# Altium footprint library SMotlaq-PCB_lib.PcbLib: 186 footprints (part 12 of 12)
Each footprint in its own frame and in the unit in brackets; x right, y up, seen from the top. Pads: shape width x height; smd on the part's side, far side on the other; paste and mask are expansions set on the pad; w line width, h text height; cw(c..) or ccw(c..) is an arc to the next point about the centre after c.
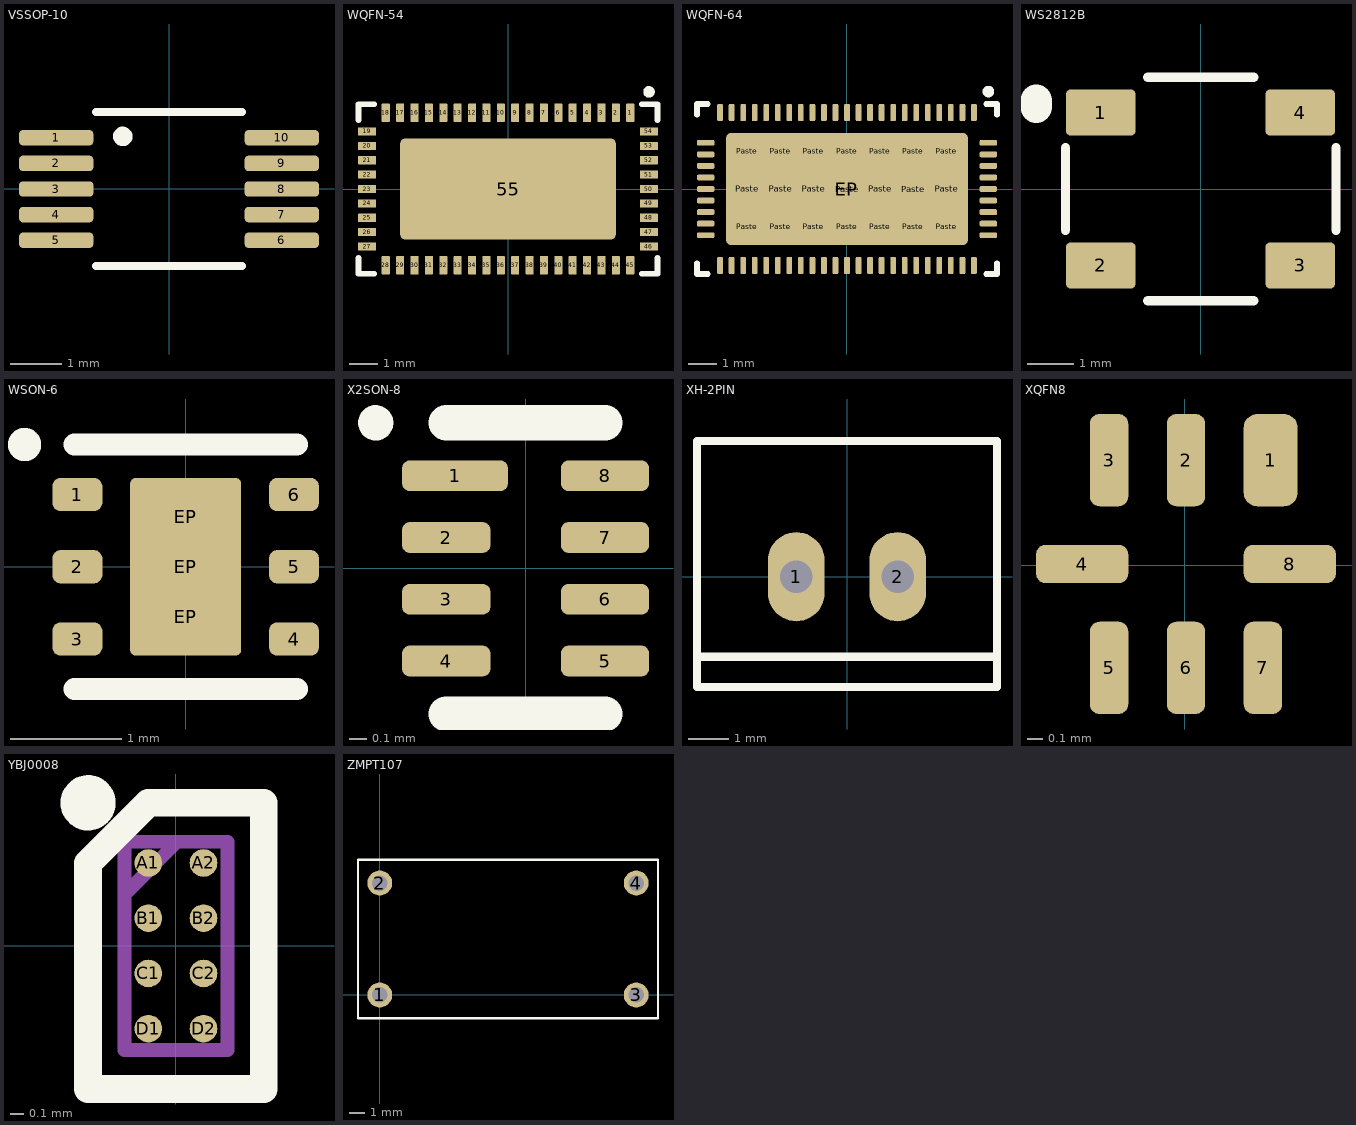
[diagram p11: the footprints below, top view; thin cyan lines are the x and y axes]

## VSSOP-10 [mm]
pads (10):
  rrect50% 1.45x0.3 smd: 1(-2.2,1) 2(-2.2,0.5) 3(-2.2,0) 4(-2.2,-0.5) 5(-2.2,-1) 6(2.2,-1) 7(2.2,-0.5) 8(2.2,0) 9(2.2,0.5) 10(2.2,1)
Top Overlay:
  circle w0.2: c-0.9,1.025 r0.09
  lines w0.15: -1.425,-1.5 1.425,-1.5 ; -1.425,1.5 1.425,1.5
3D body "User Library-DGS0010A.STEP": height 1.1, standoff 0, extent -2.462,-1.5 2.463,1.5

## WQFN-54 [mm]
pads (55):
  rrect10% 0.28x0.63 smd mask+0.075: 1(4.25,2.65) 2(3.75,2.65) 3(3.25,2.65) 4(2.75,2.65) 5(2.25,2.65) 6(1.75,2.65) 7(1.25,2.65) 8(0.75,2.65) 9(0.25,2.65) 10(-0.25,2.65) 11(-0.75,2.65) 12(-1.25,2.65) 13(-1.75,2.65) 14(-2.25,2.65) 15(-2.75,2.65) 16(-3.25,2.65) 17(-3.75,2.65) 18(-4.25,2.65) 28(-4.25,-2.65) 29(-3.75,-2.65) 30(-3.25,-2.65) 31(-2.75,-2.65) 32(-2.25,-2.65) 33(-1.75,-2.65) 34(-1.25,-2.65) 35(-0.75,-2.65) 36(-0.25,-2.65) 37(0.25,-2.65) 38(0.75,-2.65) 39(1.25,-2.65) 40(1.75,-2.65) 41(2.25,-2.65) 42(2.75,-2.65) 43(3.25,-2.65) 44(3.75,-2.65) 45(4.25,-2.65)
  rrect10% 0.63x0.28 smd mask+0.075: 19(-4.9,2) 20(-4.9,1.5) 21(-4.9,1) 22(-4.9,0.5) 23(-4.9,0) 24(-4.9,-0.5) 25(-4.9,-1) 26(-4.9,-1.5) 27(-4.9,-2) 46(4.9,-2) 47(4.9,-1.5) 48(4.9,-1) 49(4.9,-0.5) 50(4.9,0) 51(4.9,0.5) 52(4.9,1) 53(4.9,1.5) 54(4.9,2)
  rrect10% 7.5x3.51 smd paste-2539.97 mask+0.075: 55(0,0)
Top Overlay:
  circle w0.2: c4.902,3.378 r0.1
  lines w0.2: -5.2,-2.4 -5.2,-2.95 -4.65,-2.95 ; -5.2,2.4 -5.2,2.95 -4.65,2.95 ; 4.65,-2.95 5.2,-2.95 5.2,-2.4 ; 4.65,2.95 5.2,2.95 5.2,2.4
Top Paste:
  region: 3.325,-0.175 0.175,-0.175 0.175,-1.425 3.325,-1.425
  rectangle: -3.325,-1.425 -0.175,-0.175
  region: 3.325,1.425 0.175,1.425 0.175,0.175 3.325,0.175
  rectangle: -3.325,0.175 -0.175,1.425
3D body "DS80PCI800SQ_NOPB.stp": height 0.8, standoff 0, extent -5,-2.75 5,2.75

## WQFN-64 [mm]
pads (114):
  rrect50% 0.2x0.6 smd mask+0.075: 1(4.4,2.65) 2(4,2.65) 3(3.6,2.65) 4(3.2,2.65) 5(2.8,2.65) 6(2.4,2.65) 7(2,2.65) 8(1.6,2.65) 9(1.2,2.65) 10(0.8,2.65) 11(0.4,2.65) 12(0,2.65) 13(-0.4,2.65) 14(-0.8,2.65) 15(-1.2,2.65) 16(-1.6,2.65) 17(-2,2.65) 18(-2.4,2.65) 19(-2.8,2.65) 20(-3.2,2.65) 21(-3.6,2.65) 22(-4,2.65) 23(-4.4,2.65) 33(-4.4,-2.65) 34(-4,-2.65) 35(-3.6,-2.65) 36(-3.2,-2.65) 37(-2.8,-2.65) 38(-2.4,-2.65) 39(-2,-2.65) 40(-1.6,-2.65) 41(-1.2,-2.65) 42(-0.8,-2.65) 43(-0.4,-2.65) 44(0,-2.65) 45(0.4,-2.65) 46(0.8,-2.65) 47(1.2,-2.65) 48(1.6,-2.65) 49(2,-2.65) 50(2.4,-2.65) 51(2.8,-2.65) 52(3.2,-2.65) 53(3.6,-2.65) 54(4,-2.65) 55(4.4,-2.65)
  rrect50% 0.6x0.2 smd mask+0.075: 24(-4.9,1.6) 25(-4.9,1.2) 26(-4.9,0.8) 27(-4.9,0.4) 28(-4.9,0) 29(-4.9,-0.4) 30(-4.9,-0.8) 31(-4.9,-1.2) 32(-4.9,-1.6) 56(4.9,-1.6) 57(4.9,-1.2) 58(4.9,-0.8) 59(4.9,-0.4) 60(4.9,0) 61(4.9,0.4) 62(4.9,0.8) 63(4.9,1.2) 64(4.9,1.6)
  rrect10% 8.4x3.9 smd paste-2539.97 mask+0.075: EP(0,0)
  rrect20% 0.95x1.06 on Top Paste mask+0.1: Paste(-3.45,-1.31) Paste(-3.45,1.31) Paste(-2.3,-1.31) Paste(-2.3,1.31) Paste(-1.15,-1.31) Paste(-1.15,1.31) Paste(0,-1.31) Paste(0,1.31) Paste(1.15,-1.31) Paste(1.15,1.31) Paste(2.3,-1.31) Paste(2.3,1.31) Paste(3.45,-1.31) Paste(3.45,1.31)
  rrect20% 0.95x1.16 on Top Paste mask+0.1: Paste(-3.45,0) Paste(-2.3,0) Paste(-1.15,0) Paste(0,0) Paste(1.15,0) Paste(2.3,0) Paste(3.45,0)
  round 0.2 on Mech13 mask+0.1: VIAS(-4.05,-0.68) VIAS(-4.05,0.68) VIAS(-2.893,0.68) VIAS(-2.893,-0.68) VIAS(-2.893,1.8) VIAS(-2.893,-1.8) VIAS(-1.736,-0.68) VIAS(-1.736,0.68) VIAS(-1.736,-1.8) VIAS(-1.736,1.8) VIAS(-0.579,0.68) VIAS(-0.579,-0.68) VIAS(-0.579,-1.8) VIAS(-0.579,1.8) VIAS(0.579,-0.68) VIAS(0.579,-1.8) VIAS(0.579,0.68) VIAS(0.579,1.8) VIAS(1.736,-0.68) VIAS(1.736,0.68) VIAS(1.736,1.8) VIAS(1.736,-1.8) VIAS(2.893,-0.68) VIAS(2.893,0.68) VIAS(2.893,1.8) VIAS(2.893,-1.8) VIAS(4.05,-0.68) VIAS(4.05,0.68)
Top Overlay:
  circle w0.2: c4.902,3.378 r0.1
  lines w0.2: -5.2,-2.575 -5.2,-2.95 -4.825,-2.95 ; -5.2,2.575 -5.2,2.95 -4.825,2.95 ; 4.825,-2.95 5.2,-2.95 5.2,-2.575 ; 4.825,2.95 5.2,2.95 5.2,2.575
3D body "DS160PR810NJXT.stp": height 0.8, standoff 0, extent -5,-2.75 5,2.75

## WS2812B [mm]
pads (4):
  rrect20% 1.5x1 smd: 1(-2.159,1.651) 2(-2.159,-1.651) 3(2.15,-1.651) 4(2.15,1.651)
Top Overlay:
  lines w0.2: -2.921,-0.889 -2.921,0.889 ; -1.143,-2.413 1.143,-2.413 ; -1.143,2.413 1.143,2.413 ; 2.921,-0.889 2.921,0.889
  lines w0.7: -3.556,1.778 -3.556,1.905
3D body "User Library-ws2812B-1.STEP": height 1.55, standoff -0.02, extent -2.712,-2.497 2.688,2.503

## WSON-6 [mm]
height 0.7
pads (9):
  rrect50% 0.45x0.3 smd mask+0.1: 1(-0.975,0.65) 2(-0.975,0) 3(-0.975,-0.65) 4(0.975,-0.65) 5(0.975,0) 6(0.975,0.65)
  rrect10% 1x0.7 on Top Paste mask+0.1: EP(0,-0.45) EP(0,0.45)
  rrect10% 1x1.6 smd paste-2539.97 mask+0.1: EP(0,0)
Top Overlay:
  circle w0.2: c-1.45,1.1 r0.05
  lines w0.2: -1,-1.1 1,-1.1 ; -1,1.1 1,1.1
Mechanical 13:
  circle w0.05: c0,-0.55 r0.05
  circle w0.05: c0,0.55 r0.05
3D body "TLV76733DRVR.stp": height 0.8, standoff 0, extent -1,-1 1,1

## X2SON-8 [mm]
height 0.4
pads (8):
  rrect50% 0.6x0.175 smd: 1(-0.4,0.525)
  rrect50% 0.5x0.175 smd: 2(-0.45,0.175) 3(-0.45,-0.175) 4(-0.45,-0.525) 5(0.45,-0.525) 6(0.45,-0.175) 7(0.45,0.175) 8(0.45,0.525)
Top Overlay:
  circle w0.1: c-0.85,0.825 r0.05
  lines w0.2: -0.45,-0.825 0.45,-0.825 ; -0.45,0.825 0.45,0.825
3D body "SN74LVC1G74DQER.stp": height 0.4, standoff 0, extent -0.5,-0.7 0.5,0.7

## XH-2PIN [mm]
pads (2):
  rrect100% 1.4x2.2 hole 0.8: 1(-1.25,0) 2(1.25,0)
Top Overlay:
  lines w0.2: -3.7,-1.975 3.7,-1.975 ; -3.7,-2.725 3.7,-2.725 3.7,3.35 -3.7,3.35 -3.7,-2.725
3D body "User Library-XH-A-2.step": height 7, standoff -3.4, extent -3.7,-2.75 3.7,3.35

## XQFN8 [mm]
pads (8):
  rrect50% 0.35x0.6 smd mask+0.05: 1(0.557,0.683)
  rrect50% 0.25x0.6 smd mask+0.05: 2(0.007,0.683) 3(-0.493,0.683) 5(-0.493,-0.667) 6(0.007,-0.667) 7(0.507,-0.667)
  rrect50% 0.6x0.25 smd mask+0.05: 4(-0.668,0.008) 8(0.682,0.008)
3D body "User Library-sot902-2.STEP": height 0.5, standoff 0, extent -0.793,-0.792 0.807,0.808

## YBJ0008 [mm]
pads (8):
  round 0.2 smd: A1(-0.2,0.6) A2(0.2,0.6) B1(-0.2,0.2) B2(0.2,0.2) C1(-0.2,-0.2) C2(0.2,-0.2) D1(-0.2,-0.6) D2(0.2,-0.6)
Top Overlay:
  circle w0.2: c-0.636,1.036 r0.1
  lines w0.2: -0.201,1.035 -0.637,0.599 -0.637,-1.037 0.636,-1.037 0.636,1.036 -0.2,1.036
Mechanical 15:
  lines w0.1: -0.372,0.372 0.01,0.754 ; -0.372,-0.754 -0.372,0.754 0.373,0.754 0.373,-0.754 -0.372,-0.754
3D body "INA234BIYBJR.stp": height 0.35, standoff 0, extent -0.373,-0.754 0.373,0.754

## ZMPT107 [mm]
pads (4):
  round 1.6 hole 1: 1(0,0) 2(0,7.2) 3(16.5,0) 4(16.5,7.2)
Top Overlay:
  lines w0.15: -1.4,-1.5 -1.4,8.7 17.9,8.7 17.9,-1.5 -1.4,-1.5
3D body "User Library-ZMPT107.step": height 18.2, standoff -5.25, extent -1.4,-1.5 17.9,8.7